# Altium footprint library THU.PcbLib: 477 footprints (part 6 of 30)
Each footprint in its own frame and in the unit in brackets; x right, y up, seen from the top. Pads: shape width x height; smd on the part's side, far side on the other; paste and mask are expansions set on the pad; w line width, h text height; cw(c..) or ccw(c..) is an arc to the next point about the centre after c.
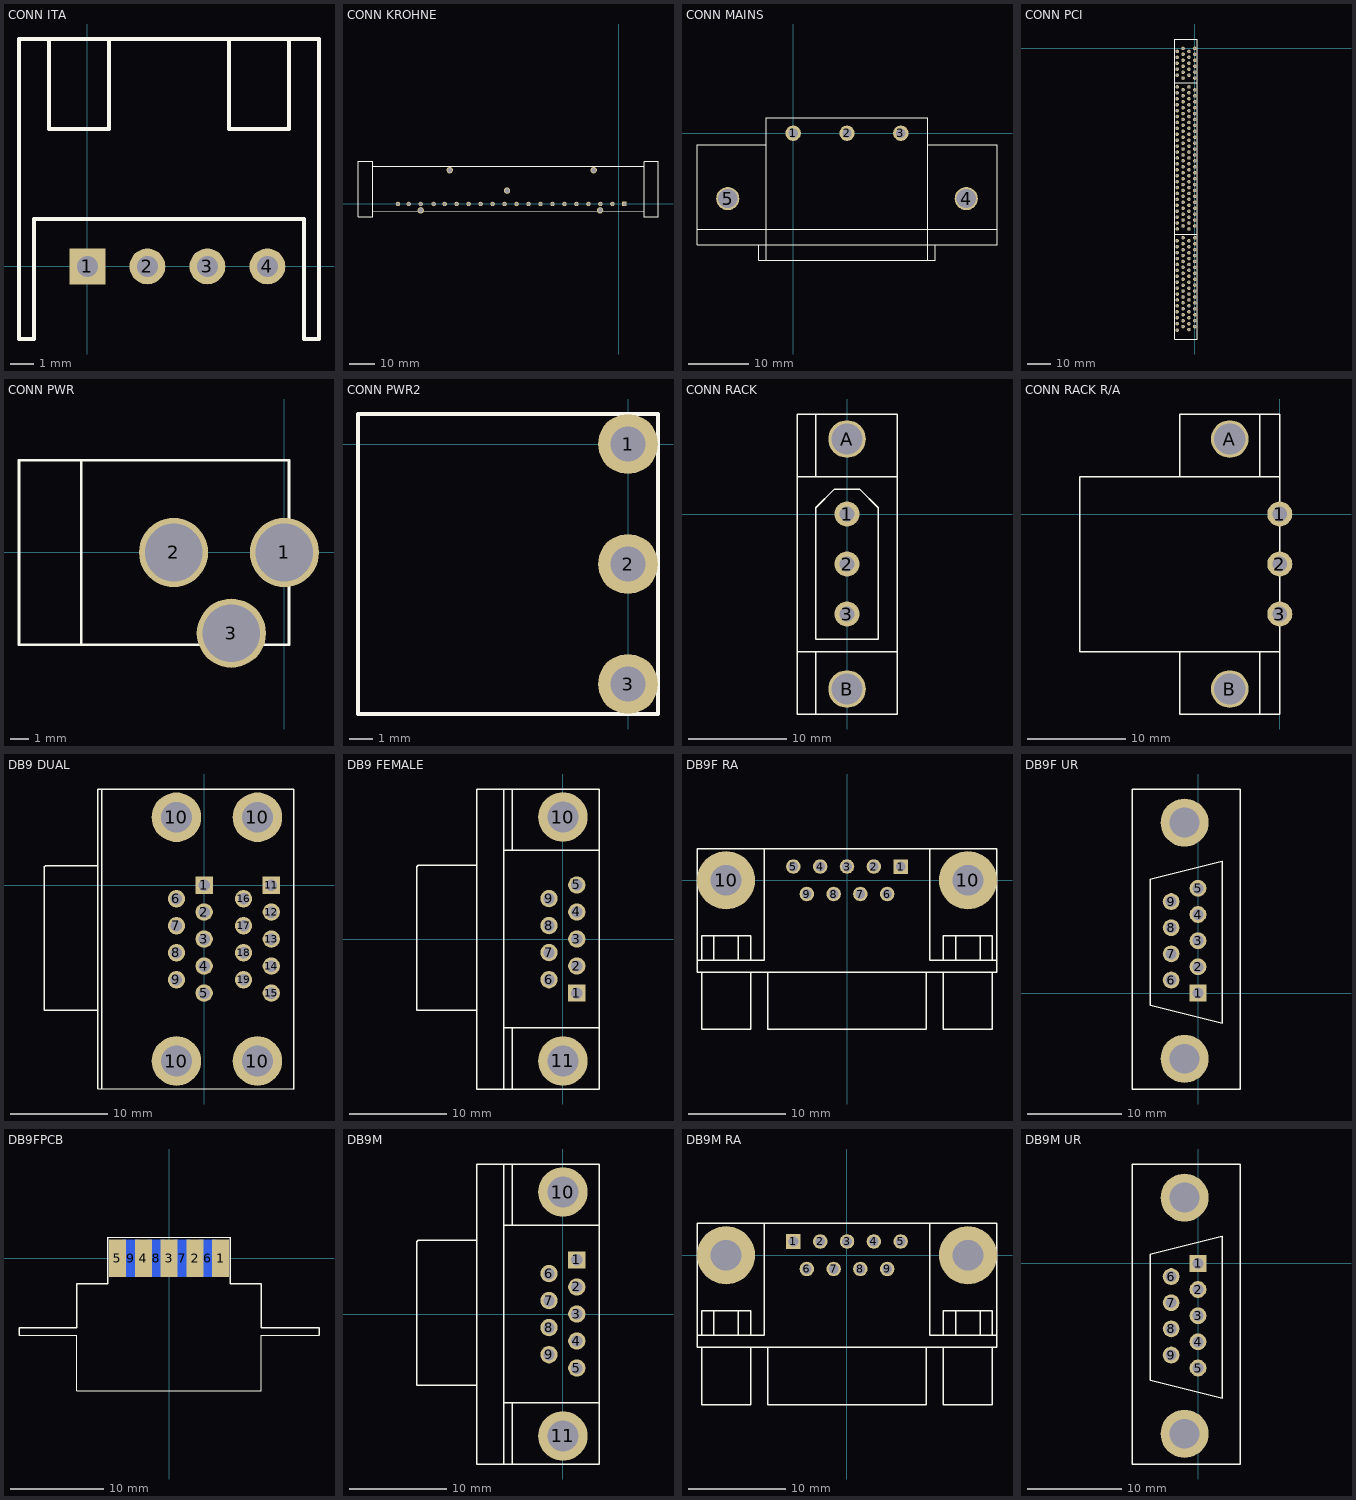
[diagram p5: the footprints below, top view; thin cyan lines are the x and y axes]

## CONN ITA [mil]
pads (4):
  rect 60x60 hole 35: 1(0,0)
  round 60 hole 35: 2(100,0) 3(200,0) 4(300,0)
TopOverlay:
  lines w6: -64,379 -64,229 36,229 36,379 ; 236,379 236,229 336,229 336,379 ; -114,-121 -89,-121 -89,79 361,79 361,-121 386,-121 386,379 -114,379 -114,-121

## CONN KROHNE [mil]
pads (25):
  rect 70x70 hole 49: 1(86,0)
  round 70 hole 49: 2(-102,0) 3(-290,0) 4(-478,0) 5(-666,0) 6(-854,0) 7(-1042,0) 8(-1230,0) 9(-1418,0) 10(-1606,0) 11(-1794,0) 12(-1982,0) 13(-2170,0) 14(-2358,0) 15(-2546,0) 16(-2734,0) 17(-2906.13,0) 18(-3110,0) 19(-3298,0) 20(-3467.15,0)
  round 100 hole 70: 21(-3110,-100) 22(-295,-100) 23(-395,530) 24(-1755,210) 25(-2655,530)
TopOverlay:
  lines w6: -3874.02,-196.85 -3866.14,-196.85 ; -3866.14,-102.36 -3866.14,-196.85 ; 393.7,-196.85 614.17,-196.85 ; 393.7,590.55 -3866.14,590.55 ; 395,-200 395,665 ; 395,-120 -3866.14,-118.11 -3866.14,590.55 ; 395,670 614.17,669.29 614.17,-196.85 ; -4094.49,-196.85 -4094.49,661.42 -4094.49,669.29 -3866.14,669.29 -3866.14,590.55 ; -4094.49,-196.85 -4094.49,-196.85 ; -4094.49,-196.85 -3866.14,-196.85 ; 614.17,-196.85 614.17,-196.85

## CONN MAINS [mil]
pads (5):
  round 100 hole 60: 1(0,0) 2(350,0) 3(700,0)
  round 150 hole 125: 4(1125,-425) 5(-425,-425)
TopOverlay:
  lines w6: -175,-75 -625,-75 -625,-625 ; 875,-75 1325,-75 1325,-625 ; -625,-625 1325,-625 ; -625,-625 -625,-725 -225,-725 ; -225,-725 925,-725 ; -225,-725 -225,-825 -175,-825 ; -175,-825 -175,100 875,100 875,-825 ; -175,-825 875,-825 ; 875,-825 925,-825 925,-725 ; 925,-725 1325,-725 1325,-625

## CONN PCI [mil]
pads (184):
  round 60 hole 32: A1(0,0) A2(-100,-50) A3(0,-100) A4(-100,-150) A5(0,-200) A6(-100,-250) A7(0,-300) A8(-100,-350) A9(0,-400) A10(-100,-450) A11(0,-500) A12(-100,-650) A13(0,-700) A14(-100,-750) A15(0,-800) A16(-100,-850) A17(0,-900) A18(-100,-950) A19(0,-1000) A20(-100,-1050) A21(0,-1100) A22(-100,-1150) A23(0,-1200) A24(-100,-1250) A25(0,-1300) A26(-100,-1350) A27(0,-1400) A28(-100,-1450) A29(0,-1500) A30(-100,-1550) A31(0,-1600) A32(-100,-1650) A33(0,-1700) A34(-100,-1750) A35(0,-1800) A36(-100,-1850) A37(0,-1900) A38(-100,-1950) A39(0,-2000) A40(-100,-2050) A41(0,-2100) A42(-100,-2150) A43(0,-2200) A44(-100,-2250) A45(0,-2300) A46(-100,-2350) A47(0,-2400) A48(-100,-2450) A49(0,-2500) A50(-100,-2550) A51(0,-2600) A52(-100,-2650) A53(0,-2700) A54(-100,-2750) A55(0,-2800) A56(-100,-2850) A57(0,-2900) A58(-100,-2950) A59(0,-3000) A60(-100,-3050) A61(0,-3200) A62(-100,-3250) A63(0,-3300) A64(-100,-3350) A65(0,-3400) A66(-100,-3450) A67(0,-3500) A68(-100,-3550) A69(0,-3600) A70(-100,-3650) A71(0,-3700) A72(-100,-3750) A73(0,-3800) A74(-100,-3850) A75(0,-3900) A76(-100,-3950) A77(0,-4000) A78(-100,-4050) A79(0,-4100) A80(-100,-4150) A81(0,-4200) A82(-100,-4250) A83(0,-4300) A84(-100,-4350) A85(0,-4400) A86(-100,-4450) A87(0,-4500) A88(-100,-4550) A89(0,-4600) A90(-100,-4650) A91(0,-4700) A92(-100,-4750) B1(-200,0) B2(-300,-50) B3(-200,-100) B4(-300,-150) B5(-200,-200) B6(-300,-250) B7(-200,-300) B8(-300,-350) B9(-200,-400) B10(-300,-450) B11(-200,-500) B12(-300,-650) B13(-200,-700) B14(-300,-750) B15(-200,-800) B16(-300,-850) B17(-200,-900) B18(-300,-950) B19(-200,-1000) B20(-300,-1050) B21(-200,-1100) B22(-300,-1150) B23(-200,-1200) B24(-300,-1250) B25(-200,-1300) B26(-300,-1350) B27(-200,-1400) B28(-300,-1450) B29(-200,-1500) B30(-300,-1550) B31(-200,-1600) B32(-300,-1650) B33(-200,-1700) B34(-300,-1750) B35(-200,-1800) B36(-300,-1850) B37(-200,-1900) B38(-300,-1950) B39(-200,-2000) B40(-300,-2050) B41(-200,-2100) B42(-300,-2150) B43(-200,-2200) B44(-300,-2250) B45(-200,-2300) B46(-300,-2350) B47(-200,-2400) B48(-300,-2450) B49(-200,-2500) B50(-300,-2550) B51(-200,-2600) B52(-300,-2650) B53(-200,-2700) B54(-300,-2750) B55(-200,-2800) B56(-300,-2850) B57(-200,-2900) B58(-300,-2950) B59(-200,-3000) B60(-300,-3050) B61(-200,-3200) B62(-300,-3250) B63(-200,-3300) B64(-300,-3350) B65(-200,-3400) B66(-300,-3450) B67(-200,-3500) B68(-300,-3550) B69(-200,-3600) B70(-300,-3650) B71(-200,-3700) B72(-300,-3750) B73(-200,-3800) B74(-300,-3850) B75(-200,-3900) B76(-300,-3950) B77(-200,-4000) B78(-300,-4050) B79(-200,-4100) B80(-300,-4150) B81(-200,-4200) B82(-300,-4250) B83(-200,-4300) B84(-300,-4350) B85(-200,-4400) B86(-300,-4450) B87(-200,-4500) B88(-300,-4550) B89(-200,-4600) B90(-300,-4650) B91(-200,-4700) B92(-300,-4760)
TopOverlay:
  lines w6: -340,-3140 40,-3140 ; -340,-580 40,-580 ; -340,-4910 40,-4910 40,160 -340,160 -340,-4910

## CONN PWR [mil]
pads (3):
  round 150 hole 125: 1(0,0) 2(-240,0) 3(-115,-175)
TopOverlay:
  lines w6: -440,-200 -440,200 ; -575,-200 -575,200 10,200 10,-200 -575,-200

## CONN PWR2 [mil]
pads (3):
  round 100 hole 59: 1(0,0) 2(0,-200) 3(0,-400)
TopOverlay:
  lines w6: -450,-450 50,-450 50,50 -450,50 -450,-450

## CONN RACK [mil]
pads (5):
  round 100 hole 59: 1(0,0) 2(0,-200) 3(0,-400)
  round 150 hole 125: A(0,300) B(0,-700)
TopOverlay:
  lines w6: -200,-550 200,-550 ; -200,150 200,150 ; -125,-800 -125,-550 ; -125,150 -125,400 ; -200,-800 200,-800 200,400 -200,400 -200,-800 ; -125,-500 125,-500 125,25 50,100 -50,100 -125,25 -125,-500

## CONN RACK R/A [mil]
pads (5):
  round 100 hole 59: 1(0,0) 2(0,-200) 3(0,-400)
  round 150 hole 125: A(-200,300) B(-200,-700)
TopOverlay:
  lines w6: -80,-800 -80,-550 ; -80,150 -80,400 ; 0,-550 -400,-550 ; 0,150 -400,150 ; -400,-550 -400,-800 0,-800 0,400 -400,400 -400,150 ; -400,-550 -800,-550 -800,150 -400,150

## DB9 DUAL [mil]
pads (22):
  rect 70x70 hole 46: 1(0,0) 11(271,0)
  round 70 hole 46: 2(0,-109) 3(0,-218) 4(0,-327) 5(0,-436) 6(-112,-55) 7(-112,-164) 8(-112,-273) 9(-112,-382) 12(271,-109) 13(271,-218) 14(271,-327) 15(271,-436) 16(159,-55) 17(159,-164) 18(159,-273) 19(159,-382)
  round 200 hole 124: 10(-112,-710) 10(-112,274) 10(215,-710) 10(215,274)
TopOverlay:
  lines w6: -429,-506 -645,-506 -645,74 -640,79 -429,79 ; -414,-823 -414,387 ; -429,-822 -429,388 361,387 361,-823 -429,-822

## DB9 FEMALE [mil]
height 492.13
pads (11):
  rect 70x70 hole 46: 1(56,-218)
  round 70 hole 46: 2(56,-109) 3(56,0) 4(56,109) 5(56,218) 6(-56,-164) 7(-56,-55) 8(-56,54) 9(-56,163)
  round 200 hole 124: 10(0,492) 11(0,-492)
TopOverlay:
  lines w6: -347,-288 -357,-288 -589,-288 -589,292 -584,297 -347,297 ; -239,-605 -239,605 ; -239,-358 146,-358 ; -239,357 146,357 ; -204,-605 -204,-358 ; -204,357 -204,605 ; -347,-605 -347,605 146,605 146,-605 -347,-605
3D body "STEP-618009231121-rev1.stp": height 494.09, standoff -123.23, extent -607.35,-607.3 121,605.3

## DB9F RA [mm] "FEMALE DB 9 RA - TYCO CONNECTOR"
height 12.55
pads (11):
  rect 1.5x1.5 hole 1: 1(5.54,1.42)
  round 1.5 hole 1: 2(2.77,1.42) 3(0,1.42) 4(-2.77,1.42) 5(-5.54,1.42) 6(4.155,-1.42) 7(1.385,-1.42) 8(-1.385,-1.42) 9(-4.155,-1.42)
  round 6 hole 3.2: 10(-12.5,0) 10(12.5,0)
TopOverlay:
  lines w0.152: -15.495,-8.255 -8.545,-8.255 -8.545,3.28 ; -15.022,-9.52 -15.022,-15.42 -9.968,-15.42 -9.968,-9.52 ; -15.022,-8.255 -15.022,-5.715 -9.942,-5.715 -9.942,-8.255 ; -13.752,-8.255 -13.752,-5.715 ; -12.495,0 -12.482,0.013 ; -11.212,-8.255 -11.212,-5.715 ; -8.164,-9.52 -8.164,-15.42 8.164,-15.42 8.164,-9.52 ; 8.545,3.28 8.545,-8.255 15.495,-8.255 ; 9.942,-8.255 9.942,-5.715 15.022,-5.715 15.022,-8.255 ; 9.968,-9.52 9.968,-15.42 15.022,-15.42 15.022,-9.52 ; 11.212,-8.255 11.212,-5.715 ; 13.752,-8.255 13.752,-5.715 ; -15.495,-9.52 15.495,-9.52 15.495,3.28 -15.495,3.28 -15.495,-9.52
3D body "STEP-618009231121-rev1.stp": height 12.55, standoff -3.13, extent -15.4,-15.427 15.4,3.073

## DB9F UR [mil]
pads (11):
  rect 70x70 hole 46: 1(0,0)
  round 70 hole 46: 2(0,109) 3(0,218) 4(0,327) 5(0,436) 6(-112,54) 7(-112,163) 8(-112,272) 9(-112,381)
  round 200 hole 124: ""(-56,-274) ""(-56,710)
TopOverlay:
  lines w6: -275,-400 175,-400 175,-375 175,850 -275,850 -275,-400 ; -200,-50 100,-125 100,550 -200,475 -200,-50

## DB9FPCB [mm]
pads (9):
  rect 1.8x4 smd: 1(5.55,0) 2(2.8,0) 3(0,0) 4(-2.75,0) 5(-5.55,0)
  rect 1.8x4 smd far side: 6(4.175,0) 7(1.425,0) 8(-1.375,0) 9(-4.125,0)
TopOverlay:
  lines w0.127: -16.129,-8.255 -9.906,-8.255 -9.906,-14.255 9.906,-14.255 9.906,-8.255 16.129,-8.255 ; -6.604,2.274 -0.009,2.274 6.586,2.274
  lines w0.152: -16.129,-8.255 -16.129,-7.493 -9.906,-7.493 -9.906,-2.726 -6.604,-2.726 -6.604,2.274 ; 6.604,2.274 6.604,-2.726 9.906,-2.726 9.906,-7.493 16.129,-7.493 16.129,-8.255

## DB9M [mil]
pads (11):
  rect 70x70 hole 46: 1(56,218)
  round 70 hole 46: 2(56,109) 3(56,0) 4(56,-109) 5(56,-218) 6(-56,163) 7(-56,54) 8(-56,-55) 9(-56,-164)
  round 200 hole 124: 10(0,492) 11(0,-492)
TopOverlay:
  lines w6: -347,-288 -357,-288 -589,-288 -589,292 -584,297 -347,297 ; -239,-605 -239,605 ; -239,-358 146,-358 ; -239,357 146,357 ; -204,-605 -204,-358 ; -204,357 -204,605 ; -347,-605 146,-605 146,605 -347,605 -347,-605

## DB9M RA [mm] "MALE DB 9 RA - TYCO CONNECTOR"
height 12.55
pads (11):
  rect 1.5x1.5 hole 1: 1(-5.535,1.42)
  round 1.5 hole 1: 2(-2.765,1.42) 3(0.005,1.42) 4(2.775,1.42) 5(5.545,1.42) 6(-4.155,-1.42) 7(-1.385,-1.42) 8(1.385,-1.42) 9(4.155,-1.42)
  round 6 hole 3.2: ""(-12.495,0) ""(12.495,0)
TopOverlay:
  lines w0.152: -15.495,-8.255 -8.545,-8.255 -8.545,3.28 ; -15.022,-9.52 -15.022,-15.42 -9.968,-15.42 -9.968,-9.52 ; -15.022,-8.255 -15.022,-5.715 -9.942,-5.715 -9.942,-8.255 ; -13.752,-8.255 -13.752,-5.715 ; -12.495,0 -12.482,0.013 ; -11.212,-8.255 -11.212,-5.715 ; -8.164,-9.52 -8.164,-15.42 8.164,-15.42 8.164,-9.52 ; 8.545,3.28 8.545,-8.255 15.495,-8.255 ; 9.942,-8.255 9.942,-5.715 15.022,-5.715 15.022,-8.255 ; 9.968,-9.52 9.968,-15.42 15.022,-15.42 15.022,-9.52 ; 11.212,-8.255 11.212,-5.715 ; 13.752,-8.255 13.752,-5.715 ; -15.495,-9.52 15.495,-9.52 15.495,3.28 -15.495,3.28 -15.495,-9.52
3D body "618009231221 (rev1).stp": height 12.55, standoff -3.8, extent -15.405,-15.42 15.405,3.08

## DB9M UR [mil]
pads (11):
  rect 70x70 hole 46: 1(0,0)
  round 70 hole 46: 2(0,-109) 3(0,-218) 4(0,-327) 5(0,-436) 6(-112,-55) 7(-112,-164) 8(-112,-273) 9(-112,-382)
  round 200 hole 124: ""(-56,-710) ""(-56,274)
TopOverlay:
  lines w6: -275,-836 -275,414 175,414 175,-811 175,-836 -275,-836 ; -200,-486 -200,39 100,114 100,-561 -200,-486